# Altium schematic symbol library IC.SchLib: 555 symbols (part 6 of 15) (continued)
## LFE2M100-7FN900C (continued)
part P pins: AF24 LRC_SQ_REFCLKN, AG24 LRC_SQ_REFCLKP, AH18 LRC_SQ_VCCRX3, AH19 LRC_SQ_VCCRX2, AH20 LRC_SQ_VCCIB2, AH21 LRC_SQ_VCCTX3, AH22 LRC_SQ_VCCTX2, AH23 LRC_SQ_VCCOB2, AH24 LRC_SQ_VCCP, AH25 LRC_SQ_VCCOB1, AH26 LRC_SQ_VCCTX1, AH27 LRC_SQ_VCCTX0, AH28 LRC_SQ_VCCIB1, AH29 LRC_SQ_VCCRX1, AH30 LRC_SQ_VCCRX0, AJ18 LRC_SQ_VCCIB3, AJ19 LRC_SQ_HDINN3, AJ20 LRC_SQ_HDINN2, AJ22 LRC_SQ_HDOUTN3, AJ23 LRC_SQ_HDOUTN2, AJ24 LRC_SQ_VCCAUX33, AJ25 LRC_SQ_HDOUTN1, AJ26 LRC_SQ_HDOUTN0, AJ28 LRC_SQ_HDINN1, AJ29 LRC_SQ_HDINN0, AJ30 LRC_SQ_VCCIB0, AK19 LRC_SQ_HDINP3, AK20 LRC_SQ_HDINP2, AK21 LRC_SQ_VCCOB3, AK22 LRC_SQ_HDOUTP3, AK23 LRC_SQ_HDOUTP2, AK25 LRC_SQ_HDOUTP1, AK26 LRC_SQ_HDOUTP0, AK27 LRC_SQ_VCCOB0, AK28 LRC_SQ_HDINP1, AK29 LRC_SQ_HDINP0
part Q pins: AF7 LLC_SQ_REFCLKN, AG7 LLC_SQ_REFCLKP, AH1 LLC_SQ_VCCRX3, AH2 LLC_SQ_VCCRX2, AH3 LLC_SQ_VCCIB2, AH4 LLC_SQ_VCCTX3, AH5 LLC_SQ_VCCTX2, AH6 LLC_SQ_VCCOB2, AH7 LLC_SQ_VCCP, AH8 LLC_SQ_VCCOB1, AH9 LLC_SQ_VCCTX1, AH10 LLC_SQ_VCCTX0, AH11 LLC_SQ_VCCIB1, AH12 LLC_SQ_VCCRX1, AH13 LLC_SQ_VCCRX0, AJ1 LLC_SQ_VCCIB3, AJ2 LLC_SQ_HDINN3, AJ3 LLC_SQ_HDINN2, AJ5 LLC_SQ_HDOUTN3, AJ6 LLC_SQ_HDOUTN2, AJ7 LLC_SQ_VCCAUX33, AJ8 LLC_SQ_HDOUTN1, AJ9 LLC_SQ_HDOUTN0, AJ11 LLC_SQ_HDINN1, AJ12 LLC_SQ_HDINN0, AJ13 LLC_SQ_VCCIB0, AK2 LLC_SQ_HDINP3, AK3 LLC_SQ_HDINP2, AK4 LLC_SQ_VCCOB3, AK5 LLC_SQ_HDOUTP3, AK6 LLC_SQ_HDOUTP2, AK8 LLC_SQ_HDOUTP1, AK9 LLC_SQ_HDOUTP0, AK10 LLC_SQ_VCCOB0, AK11 LLC_SQ_HDINP1, AK12 LLC_SQ_HDINP0
part R pins: AB8 LLM0_PLLCAP, AB22 RLM0_PLLCAP, G23 XRES
part A text: SUPPLIES
part B text: SUPPLIES
part D text: BANK 0
part E text: BANK 1
part F text: BANK 2
part G text: BANK 3
part H text: BANK 4
part I text: BANK 5
part J text: BANK 6
part K text: BANK 7
part L text: BANK 8
part M text: JTAG
part N text: SERDES
part O text: SERDES
part P text: SERDES
part Q text: SERDES

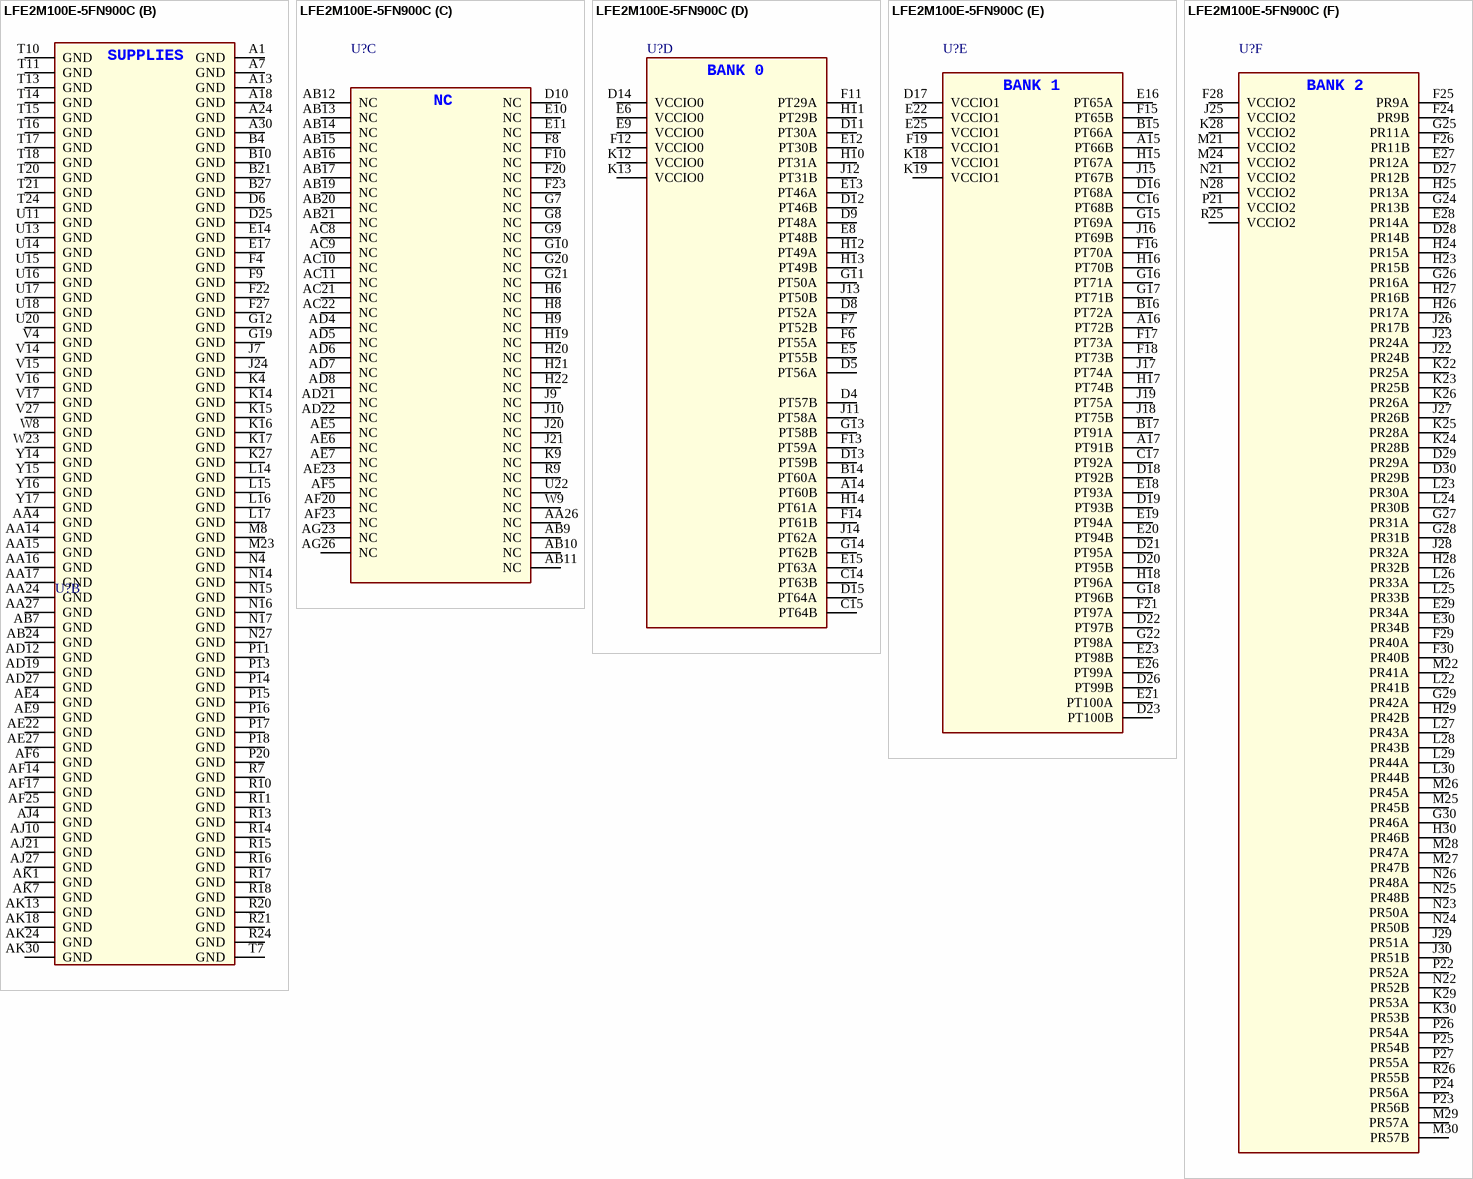
[diagram p23: symbol LFE2M100E-5FN900C]

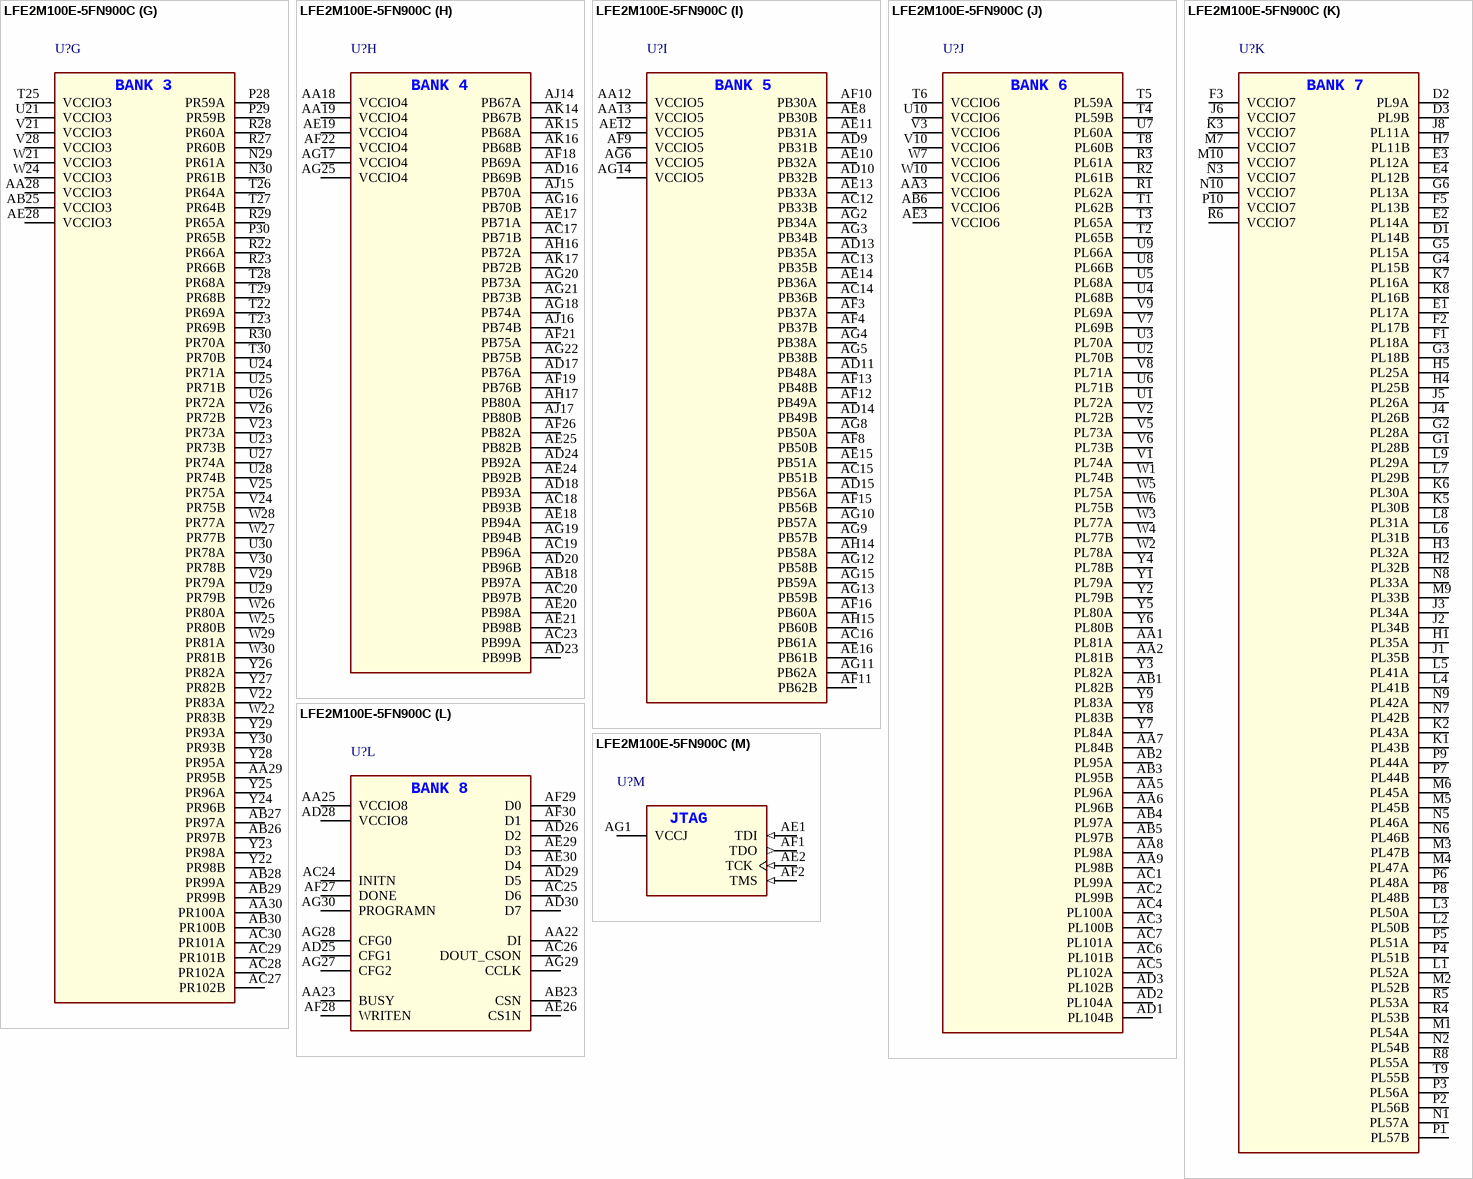
[diagram p24: symbol LFE2M100E-5FN900C]

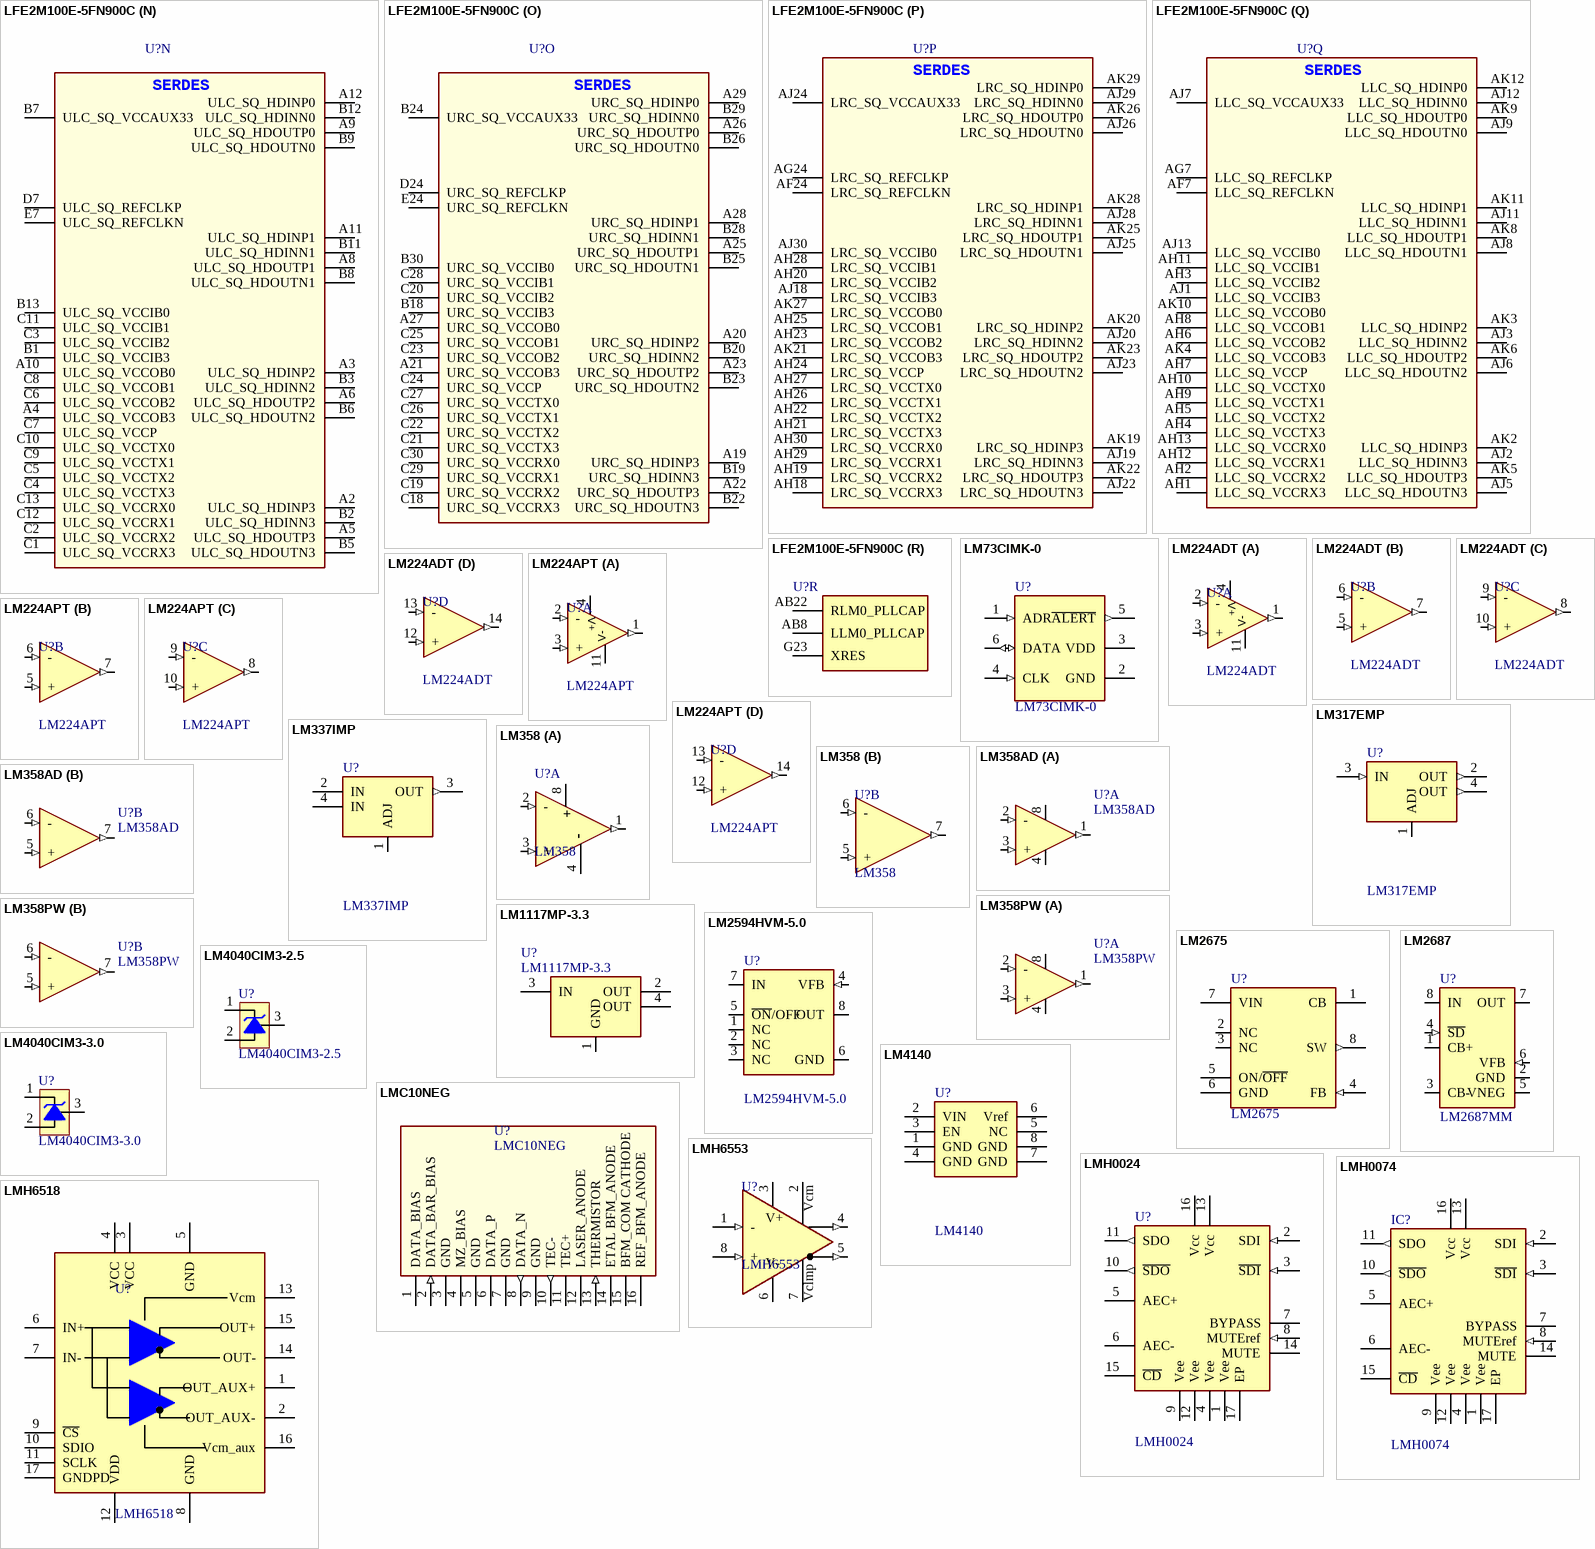
[diagram p25: symbols LFE2M100E-5FN900C to LMH6553]

## LFE2M100E-5FN900C
designator U?, comment LFE2M100-5FN900C  (value not drawn)
ECP2M 1.2V  FPGA, 416 I/Os, 95K LUTs, 900-Ball fpBGA, Speed Grade 5, Commercial Grade, Pb-Free; Manufacturer: Lattice; Sort: 510; Tech: SMDR; Manufacturer No: LFE2M100-5FN900C; Package: FPBGA900; Price: 0
footprint FPBGA900 (BGA, 900-Leads, Body 31,0x31,0mm,  Pitch 1,00mm)
part A pins: AA10 VCCAUX (power), AA11 VCCAUX (power), AA20 VCCAUX (power), AA21 VCCAUX (power), K10 VCCAUX (power), K11 VCCAUX (power), K20 VCCAUX (power), K21 VCCAUX (power), L10 VCCAUX (power), L11 VCCAUX (power), L12 VCC (power), L13 VCC (power), L18 VCC (power), L19 VCC (power), L20 VCCAUX (power), L21 VCCAUX (power), M11 VCC (power), M12 VCC (power), M13 VCC (power), M14 VCC (power), M15 VCC (power), M16 VCC (power), M17 VCC (power), M18 VCC (power), M19 VCC (power), M20 VCC (power), N11 VCC (power), N12 VCC (power), N13 VCCPLL (power), N18 VCCPLL (power), N19 VCC (power), N20 VCC (power), P12 VCC (power), P19 VCC (power), R12 VCC (power), R19 VCC (power), T12 VCC (power), T19 VCC (power), U12 VCC (power), U19 VCC (power), V11 VCC (power), V12 VCC (power), V13 VCCPLL (power), V18 VCCPLL (power), V19 VCC (power), V20 VCC (power), W11 VCC (power), W12 VCC (power), W13 VCC (power), W14 VCC (power), W15 VCC (power), W16 VCC (power), W17 VCC (power), W18 VCC (power), W19 VCC (power), W20 VCC (power), Y10 VCCAUX (power), Y11 VCCAUX (power), Y12 VCC (power), Y13 VCC (power), Y18 VCC (power), Y19 VCC (power), Y20 VCCAUX (power), Y21 VCCAUX (power)
part B pins: A1 GND (power), A7 GND (power), A13 GND (power), A18 GND (power), A24 GND (power), A30 GND (power), AA4 GND (power), AA14 GND (power), AA15 GND (power), AA16 GND (power), AA17 GND (power), AA24 GND (power), AA27 GND (power), AB7 GND (power), AB24 GND (power), AD12 GND (power), AD19 GND (power), AD27 GND (power), AE4 GND (power), AE9 GND (power), AE22 GND (power), AE27 GND (power), AF6 GND (power), AF14 GND (power), AF17 GND (power), AF25 GND (power), AJ4 GND (power), AJ10 GND (power), AJ21 GND (power), AJ27 GND (power), AK1 GND (power), AK7 GND (power), AK13 GND (power), AK18 GND (power), AK24 GND (power), AK30 GND (power), B4 GND (power), B10 GND (power), B21 GND (power), B27 GND (power), D6 GND (power), D25 GND (power), E14 GND (power), E17 GND (power), F4 GND (power), F9 GND (power), F22 GND (power), F27 GND (power), G12 GND (power), G19 GND (power), J7 GND (power), J24 GND (power), K4 GND (power), K14 GND (power), K15 GND (power), K16 GND (power), K17 GND (power), K27 GND (power), L14 GND (power), L15 GND (power), L16 GND (power), L17 GND (power), M8 GND (power), M23 GND (power), N4 GND (power), N14 GND (power), N15 GND (power), N16 GND (power), N17 GND (power), N27 GND (power), P11 GND (power), P13 GND (power), P14 GND (power), P15 GND (power), P16 GND (power), P17 GND (power), P18 GND (power), P20 GND (power), R7 GND (power), R10 GND (power), R11 GND (power), R13 GND (power), R14 GND (power), R15 GND (power), R16 GND (power), R17 GND (power), R18 GND (power), R20 GND (power), R21 GND (power), R24 GND (power), T7 GND (power), T10 GND (power), T11 GND (power), T13 GND (power), T14 GND (power), T15 GND (power), T16 GND (power), T17 GND (power), T18 GND (power), T20 GND (power), T21 GND (power), T24 GND (power), U11 GND (power), U13 GND (power), U14 GND (power), U15 GND (power), U16 GND (power), U17 GND (power), U18 GND (power), U20 GND (power), V4 GND (power), V14 GND (power), V15 GND (power), V16 GND (power), V17 GND (power), V27 GND (power), W8 GND (power), W23 GND (power), Y14 GND (power), Y15 GND (power), Y16 GND (power), Y17 GND (power)
part C pins: AA26 NC, AB9 NC, AB10 NC, AB11 NC, AB12 NC, AB13 NC, AB14 NC, AB15 NC, AB16 NC, AB17 NC, AB19 NC, AB20 NC, AB21 NC, AC8 NC, AC9 NC, AC10 NC, AC11 NC, AC21 NC, AC22 NC, AD4 NC, AD5 NC, AD6 NC, AD7 NC, AD8 NC, AD21 NC, AD22 NC, AE5 NC, AE6 NC, AE7 NC, AE23 NC, AF5 NC, AF20 NC, AF23 NC, AG23 NC, AG26 NC, D10 NC, E10 NC, E11 NC, F8 NC, F10 NC, F20 NC, F23 NC, G7 NC, G8 NC, G9 NC, G10 NC, G20 NC, G21 NC, H6 NC, H8 NC, H9 NC, H19 NC, H20 NC, H21 NC, H22 NC, J9 NC, J10 NC, J20 NC, J21 NC, K9 NC, R9 NC, U22 NC, W9 NC
part D pins: A14 PT60B, B14 PT60A, C14 PT63B, C15 PT64B, D4 PT57B, D5 PT56A, D8 PT52A, D9 PT48A, D11 PT30A, D12 PT46B, D13 PT59B, D14 VCCIO0 (power), D15 PT64A, E5 PT55B, E6 VCCIO0 (power), E8 PT48B, E9 VCCIO0 (power), E12 PT30B, E13 PT46A, E15 PT63A, F6 PT55A, F7 PT52B, F11 PT29A, F12 VCCIO0 (power), F13 PT59A, F14 PT61B, G11 PT50A, G13 PT58B, G14 PT62B, H10 PT31A, H11 PT29B, H12 PT49A, H13 PT49B, H14 PT61A, J11 PT58A, J12 PT31B, J13 PT50B, J14 PT62A, K12 VCCIO0 (power), K13 VCCIO0 (power)
part E pins: A15 PT66B, A16 PT72B, A17 PT91B, B15 PT66A, B16 PT72A, B17 PT91A, C16 PT68B, C17 PT92A, D16 PT68A, D17 VCCIO1 (power), D18 PT92B, D19 PT93B, D20 PT95B, D21 PT95A, D22 PT97B, D23 PT100B, D26 PT99B, E16 PT65A, E18 PT93A, E19 PT94A, E20 PT94B, E21 PT100A, E22 VCCIO1 (power), E23 PT98B, E25 VCCIO1 (power), E26 PT99A, F15 PT65B, F16 PT70A, F17 PT73A, F18 PT73B, F19 VCCIO1 (power), F21 PT97A, G15 PT69A, G16 PT71A, G17 PT71B, G18 PT96B, G22 PT98A, H15 PT67A, H16 PT70B, H17 PT74B, H18 PT96A, J15 PT67B, J16 PT69B, J17 PT74A, J18 PT75B, J19 PT75A, K18 VCCIO1 (power), K19 VCCIO1 (power)
part F pins: D27 PR12B, D28 PR14B, D29 PR29A, D30 PR29B, E27 PR12A, E28 PR14A, E29 PR34A, E30 PR34B, F24 PR9B, F25 PR9A, F26 PR11B, F28 VCCIO2 (power), F29 PR40A, F30 PR40B, G24 PR13B, G25 PR11A, G26 PR16A, G27 PR31A, G28 PR31B, G29 PR42A, G30 PR46A, H23 PR15B, H24 PR15A, H25 PR13A, H26 PR17A, H27 PR16B, H28 PR32B, H29 PR42B, H30 PR46B, J22 PR24B, J23 PR24A, J25 VCCIO2 (power), J26 PR17B, J27 PR26B, J28 PR32A, J29 PR51A, J30 PR51B, K22 PR25A, K23 PR25B, K24 PR28B, K25 PR28A, K26 PR26A, K28 VCCIO2 (power), K29 PR53A, K30 PR53B, L22 PR41B, L23 PR30A, L24 PR30B, L25 PR33B, L26 PR33A, L27 PR43A, L28 PR43B, L29 PR44A, L30 PR44B, M21 VCCIO2 (power), M22 PR41A, M24 VCCIO2 (power), M25 PR45B, M26 PR45A, M27 PR47B, M28 PR47A, M29 PR57A, M30 PR57B, N21 VCCIO2 (power), N22 PR52B, N23 PR50A, N24 PR50B, N25 PR48B, N26 PR48A, N28 VCCIO2 (power), P21 VCCIO2 (power), P22 PR52A, P23 PR56B, P24 PR56A, P25 PR54B, P26 PR54A, P27 PR55A, R25 VCCIO2 (power), R26 PR55B
part G pins: AA28 VCCIO3 (power), AA29 PR95B, AA30 PR100A, AB25 VCCIO3 (power), AB26 PR97B, AB27 PR97A, AB28 PR99A, AB29 PR99B, AB30 PR100B, AC27 PR102B, AC28 PR102A, AC29 PR101B, AC30 PR101A, AE28 VCCIO3 (power), N29 PR61A, N30 PR61B, P28 PR59A, P29 PR59B, P30 PR65B, R22 PR66A, R23 PR66B, R27 PR60B, R28 PR60A, R29 PR65A, R30 PR70A, T22 PR69A, T23 PR69B, T25 VCCIO3 (power), T26 PR64A, T27 PR64B, T28 PR68A, T29 PR68B, T30 PR70B, U21 VCCIO3 (power), U23 PR73B, U24 PR71A, U25 PR71B, U26 PR72A, U27 PR74A, U28 PR74B, U29 PR79B, U30 PR78A, V21 VCCIO3 (power), V22 PR83A, V23 PR73A, V24 PR75B, V25 PR75A, V26 PR72B, V28 VCCIO3 (power), V29 PR79A, V30 PR78B, W21 VCCIO3 (power), W22 PR83B, W24 VCCIO3 (power), W25 PR80B, W26 PR80A, W27 PR77B, W28 PR77A, W29 PR81A, W30 PR81B, Y22 PR98B, Y23 PR98A, Y24 PR96B, Y25 PR96A, Y26 PR82A, Y27 PR82B, Y28 PR95A, Y29 PR93A, Y30 PR93B
part H pins: AA18 VCCIO4 (power), AA19 VCCIO4 (power), AB18 PB97A, AC17 PB71B, AC18 PB93B, AC19 PB96A, AC20 PB97B, AC23 PB99A, AD16 PB69B, AD17 PB76A, AD18 PB93A, AD20 PB96B, AD23 PB99B, AD24 PB92A, AE17 PB71A, AE18 PB94A, AE19 VCCIO4 (power), AE20 PB98A, AE21 PB98B, AE24 PB92B, AE25 PB82B, AF18 PB69A, AF19 PB76B, AF21 PB75A, AF22 VCCIO4 (power), AF26 PB82A, AG16 PB70B, AG17 VCCIO4 (power), AG18 PB74A, AG19 PB94B, AG20 PB73A, AG21 PB73B, AG22 PB75B, AG25 VCCIO4 (power), AH16 PB72A, AH17 PB80A, AJ14 PB67A, AJ15 PB70A, AJ16 PB74B, AJ17 PB80B, AK14 PB67B, AK15 PB68A, AK16 PB68B, AK17 PB72B
part I pins: AA12 VCCIO5 (power), AA13 VCCIO5 (power), AC12 PB33B, AC13 PB35B, AC14 PB36B, AC15 PB51B, AC16 PB61A, AD9 PB31B, AD10 PB32B, AD11 PB48A, AD13 PB35A, AD14 PB49B, AD15 PB56A, AE8 PB30B, AE10 PB32A, AE11 PB31A, AE12 VCCIO5 (power), AE13 PB33A, AE14 PB36A, AE15 PB51A, AE16 PB61B, AF3 PB37A, AF4 PB37B, AF8 PB50B, AF9 VCCIO5 (power), AF10 PB30A, AF11 PB62B, AF12 PB49A, AF13 PB48B, AF15 PB56B, AF16 PB60A, AG2 PB34A, AG3 PB34B, AG4 PB38A, AG5 PB38B, AG6 VCCIO5 (power), AG8 PB50A, AG9 PB57B, AG10 PB57A, AG11 PB62A, AG12 PB58B, AG13 PB59B, AG14 VCCIO5 (power), AG15 PB59A, AH14 PB58A, AH15 PB60B
part J pins: AA1 PL81A, AA2 PL81B, AA3 VCCIO6 (power), AA5 PL96A, AA6 PL96B, AA7 PL84B, AA8 PL98A, AA9 PL98B, AB1 PL82B, AB2 PL95A, AB3 PL95B, AB4 PL97A, AB5 PL97B, AB6 VCCIO6 (power), AC1 PL99A, AC2 PL99B, AC3 PL100B, AC4 PL100A, AC5 PL102A, AC6 PL101B, AC7 PL101A, AD1 PL104B, AD2 PL104A, AD3 PL102B, AE3 VCCIO6 (power), R1 PL62A, R2 PL61B, R3 PL61A, T1 PL62B, T2 PL65B, T3 PL65A, T4 PL59B, T5 PL59A, T6 VCCIO6 (power), T8 PL60B, U1 PL72A, U2 PL70B, U3 PL70A, U4 PL68B, U5 PL68A, U6 PL71B, U7 PL60A, U8 PL66B, U9 PL66A, U10 VCCIO6 (power), V1 PL74A, V2 PL72B, V3 VCCIO6 (power), V5 PL73A, V6 PL73B, V7 PL69B, V8 PL71A, V9 PL69A, V10 VCCIO6 (power), W1 PL74B, W2 PL78A, W3 PL77A, W4 PL77B, W5 PL75A, W6 PL75B, W7 VCCIO6 (power), W10 VCCIO6 (power), Y1 PL79A, Y2 PL79B, Y3 PL82A, Y4 PL78B, Y5 PL80A, Y6 PL80B, Y7 PL84A, Y8 PL83B, Y9 PL83A
part K pins: D1 PL14B, D2 PL9A, D3 PL9B, E1 PL17A, E2 PL14A, E3 PL12A, E4 PL12B, F1 PL18A, F2 PL17B, F3 VCCIO7 (power), F5 PL13B, G1 PL28B, G2 PL28A, G3 PL18B, G4 PL15B, G5 PL15A, G6 PL13A, H1 PL35A, H2 PL32B, H3 PL32A, H4 PL25B, H5 PL25A, H7 PL11B, J1 PL35B, J2 PL34B, J3 PL34A, J4 PL26B, J5 PL26A, J6 VCCIO7 (power), J8 PL11A, K1 PL43B, K2 PL43A, K3 VCCIO7 (power), K5 PL30B, K6 PL30A, K7 PL16A, K8 PL16B, L1 PL52A, L2 PL50B, L3 PL50A, L4 PL41B, L5 PL41A, L6 PL31B, L7 PL29B, L8 PL31A, L9 PL29A, M1 PL54A, M2 PL52B, M3 PL47B, M4 PL47A, M5 PL45B, M6 PL45A, M7 VCCIO7 (power), M9 PL33B, M10 VCCIO7 (power), N1 PL57A, N2 PL54B, N3 VCCIO7 (power), N5 PL46A, N6 PL46B, N7 PL42B, N8 PL33A, N9 PL42A, N10 VCCIO7 (power), P1 PL57B, P2 PL56B, P3 PL56A, P4 PL51B, P5 PL51A, P6 PL48A, P7 PL44B, P8 PL48B, P9 PL44A, P10 VCCIO7 (power), R4 PL53B, R5 PL53A, R6 VCCIO7 (power), R8 PL55A, T9 PL55B
part L pins: AA22 DI, AA23 BUSY, AA25 VCCIO8 (power), AB23 CSN, AC24 INITN, AC25 D6, AC26 DOUT_CSON, AD25 CFG1, AD26 D2, AD28 VCCIO8 (power), AD29 D5, AD30 D7, AE26 CS1N, AE29 D3, AE30 D4, AF27 DONE, AF28 WRITEN, AF29 D0, AF30 D1, AG27 CFG2, AG28 CFG0, AG29 CCLK, AG30 PROGRAMN
part M pins: AE1 TDI (in), AE2 TCK (in), AF1 TDO (out), AF2 TMS (in), AG1 VCCJ (power)
part N pins: A2 ULC_SQ_HDINP3, A3 ULC_SQ_HDINP2, A4 ULC_SQ_VCCOB3, A5 ULC_SQ_HDOUTP3, A6 ULC_SQ_HDOUTP2, A8 ULC_SQ_HDOUTP1, A9 ULC_SQ_HDOUTP0, A10 ULC_SQ_VCCOB0, A11 ULC_SQ_HDINP1, A12 ULC_SQ_HDINP0, B1 ULC_SQ_VCCIB3, B2 ULC_SQ_HDINN3, B3 ULC_SQ_HDINN2, B5 ULC_SQ_HDOUTN3, B6 ULC_SQ_HDOUTN2, B7 ULC_SQ_VCCAUX33, B8 ULC_SQ_HDOUTN1, B9 ULC_SQ_HDOUTN0, B11 ULC_SQ_HDINN1, B12 ULC_SQ_HDINN0, B13 ULC_SQ_VCCIB0, C1 ULC_SQ_VCCRX3, C2 ULC_SQ_VCCRX2, C3 ULC_SQ_VCCIB2, C4 ULC_SQ_VCCTX3, C5 ULC_SQ_VCCTX2, C6 ULC_SQ_VCCOB2, C7 ULC_SQ_VCCP, C8 ULC_SQ_VCCOB1, C9 ULC_SQ_VCCTX1, C10 ULC_SQ_VCCTX0, C11 ULC_SQ_VCCIB1, C12 ULC_SQ_VCCRX1, C13 ULC_SQ_VCCRX0, D7 ULC_SQ_REFCLKP, E7 ULC_SQ_REFCLKN
part O pins: A19 URC_SQ_HDINP3, A20 URC_SQ_HDINP2, A21 URC_SQ_VCCOB3, A22 URC_SQ_HDOUTP3, A23 URC_SQ_HDOUTP2, A25 URC_SQ_HDOUTP1, A26 URC_SQ_HDOUTP0, A27 URC_SQ_VCCOB0, A28 URC_SQ_HDINP1, A29 URC_SQ_HDINP0, B18 URC_SQ_VCCIB3, B19 URC_SQ_HDINN3, B20 URC_SQ_HDINN2, B22 URC_SQ_HDOUTN3, B23 URC_SQ_HDOUTN2, B24 URC_SQ_VCCAUX33, B25 URC_SQ_HDOUTN1, B26 URC_SQ_HDOUTN0, B28 URC_SQ_HDINN1, B29 URC_SQ_HDINN0, B30 URC_SQ_VCCIB0, C18 URC_SQ_VCCRX3, C19 URC_SQ_VCCRX2, C20 URC_SQ_VCCIB2, C21 URC_SQ_VCCTX3, C22 URC_SQ_VCCTX2, C23 URC_SQ_VCCOB2, C24 URC_SQ_VCCP, C25 URC_SQ_VCCOB1, C26 URC_SQ_VCCTX1, C27 URC_SQ_VCCTX0, C28 URC_SQ_VCCIB1, C29 URC_SQ_VCCRX1, C30 URC_SQ_VCCRX0, D24 URC_SQ_REFCLKP, E24 URC_SQ_REFCLKN
part P pins: AF24 LRC_SQ_REFCLKN, AG24 LRC_SQ_REFCLKP, AH18 LRC_SQ_VCCRX3, AH19 LRC_SQ_VCCRX2, AH20 LRC_SQ_VCCIB2, AH21 LRC_SQ_VCCTX3, AH22 LRC_SQ_VCCTX2, AH23 LRC_SQ_VCCOB2, AH24 LRC_SQ_VCCP, AH25 LRC_SQ_VCCOB1, AH26 LRC_SQ_VCCTX1, AH27 LRC_SQ_VCCTX0, AH28 LRC_SQ_VCCIB1, AH29 LRC_SQ_VCCRX1, AH30 LRC_SQ_VCCRX0, AJ18 LRC_SQ_VCCIB3, AJ19 LRC_SQ_HDINN3, AJ20 LRC_SQ_HDINN2, AJ22 LRC_SQ_HDOUTN3, AJ23 LRC_SQ_HDOUTN2, AJ24 LRC_SQ_VCCAUX33, AJ25 LRC_SQ_HDOUTN1, AJ26 LRC_SQ_HDOUTN0, AJ28 LRC_SQ_HDINN1, AJ29 LRC_SQ_HDINN0, AJ30 LRC_SQ_VCCIB0, AK19 LRC_SQ_HDINP3, AK20 LRC_SQ_HDINP2, AK21 LRC_SQ_VCCOB3, AK22 LRC_SQ_HDOUTP3, AK23 LRC_SQ_HDOUTP2, AK25 LRC_SQ_HDOUTP1, AK26 LRC_SQ_HDOUTP0, AK27 LRC_SQ_VCCOB0, AK28 LRC_SQ_HDINP1, AK29 LRC_SQ_HDINP0
part Q pins: AF7 LLC_SQ_REFCLKN, AG7 LLC_SQ_REFCLKP, AH1 LLC_SQ_VCCRX3, AH2 LLC_SQ_VCCRX2, AH3 LLC_SQ_VCCIB2, AH4 LLC_SQ_VCCTX3, AH5 LLC_SQ_VCCTX2, AH6 LLC_SQ_VCCOB2, AH7 LLC_SQ_VCCP, AH8 LLC_SQ_VCCOB1, AH9 LLC_SQ_VCCTX1, AH10 LLC_SQ_VCCTX0, AH11 LLC_SQ_VCCIB1, AH12 LLC_SQ_VCCRX1, AH13 LLC_SQ_VCCRX0, AJ1 LLC_SQ_VCCIB3, AJ2 LLC_SQ_HDINN3, AJ3 LLC_SQ_HDINN2, AJ5 LLC_SQ_HDOUTN3, AJ6 LLC_SQ_HDOUTN2, AJ7 LLC_SQ_VCCAUX33, AJ8 LLC_SQ_HDOUTN1, AJ9 LLC_SQ_HDOUTN0, AJ11 LLC_SQ_HDINN1, AJ12 LLC_SQ_HDINN0, AJ13 LLC_SQ_VCCIB0, AK2 LLC_SQ_HDINP3, AK3 LLC_SQ_HDINP2, AK4 LLC_SQ_VCCOB3, AK5 LLC_SQ_HDOUTP3, AK6 LLC_SQ_HDOUTP2, AK8 LLC_SQ_HDOUTP1, AK9 LLC_SQ_HDOUTP0, AK10 LLC_SQ_VCCOB0, AK11 LLC_SQ_HDINP1, AK12 LLC_SQ_HDINP0
part R pins: AB8 LLM0_PLLCAP, AB22 RLM0_PLLCAP, G23 XRES
part A text: SUPPLIES
part B text: SUPPLIES
part D text: BANK 0
part E text: BANK 1
part F text: BANK 2
part G text: BANK 3
part H text: BANK 4
part I text: BANK 5
part J text: BANK 6
part K text: BANK 7
part L text: BANK 8
part M text: JTAG
part N text: SERDES
part O text: SERDES
part P text: SERDES
part Q text: SERDES

## LM73CIMK-0
designator U?
Digital Temperature Sensor I2C SOT23-6; Manufacturer: National Semiconductors; Sort: 510; Tech: SMDR; Manufacturer No: LM73CIMK-0; Package: SOT23-6; Price: 0
footprint SOT23-6
pins: 1 ADR (in), 2 GND (power), 3 VDD (power), 4 CLK (in), 5 ~{ALERT} (out), 6 DATA (io)

## LM224ADT
designator U?
Quad Operational amplifier SOIC14; Manufacturer: STM, Farnell; Manufacturer No: LM224ADT, 1750139; Comment2: 3..30Vcc 1.3MHzbw 1.5mAcc; Sort: 510; Tech: SMDR; Package: SOIC14; Price: 0
footprint SOIC14-1 (Small IC 14 pin)
part A pins: 1 OUT (out), 2 - (in), 3 + (in), 4 +V (power), 11 -V (power)
part B pins: 5 + (in), 6 - (in), 7 OUT (out)
part C pins: 8 OUT (out), 9 - (in), 10 + (in)
part D pins: 12 + (in), 13 - (in), 14 OUT (out)
part A text: V+; V-

## LM224APT
designator U?
Quad Operational amplifier TSSOP14; Manufacturer: STM, Farnell; Manufacturer No: LM224APT, 1750140; Comment2: 3..30Vcc 0..28Vinp 1.3MHzbw 1.5mAcc; Sort: 510; Tech: SMDR; Package: TSSOP14; Price: 0.4
footprint TSSOP14 (TSSOP14 5x4.4mm R0.65mm)
part A pins: 1 OUT (out), 2 - (in), 3 + (in), 4 +V (power), 11 -V (power)
part B pins: 5 + (in), 6 - (in), 7 OUT (out)
part C pins: 8 OUT (out), 9 - (in), 10 + (in)
part D pins: 12 + (in), 13 - (in), 14 OUT (out)
part A text: V+; V-

## LM317EMP
designator U?
3-Terminal Adjustable Regulator 1A; Manufacturer: National Semiconductor; Comment2: 40Vin, 1A; Sort: 510; Tech: SMDR; Manufacturer No: LM317EMP; Package: DDPak5; Price: 0
footprint SOT223
pins: 1 ADJ (hiz), 2 OUT (out), 3 IN (in), 4 OUT (out)

## LM337IMP
designator U?
3-Terminal Negative Adjustable Regulator 1A; Manufacturer: National Semiconductor, Farnell; Manufacturer No: LM337IMP, 9779213; Comment2: -1.2..-37Vout -40Vin  1Aout; Sort: 510; Tech: SMDR; Package: SOT223; Price: 2
footprint SOT223
pins: 1 ADJ, 2 IN (power), 3 OUT (out), 4 IN (power)

## LM358
designator U?
Operational amplifier; Manufacturer: National Semiconductors; Manufacturer No: LM358M; Sort: 510; Tech: SMDR; Package: SO8; Price: 0
footprint SOIC8-1
part A pins: 1 OUT (out), 2 - (in), 3 + (in), 4 -V (power), 8 +V (power)
part B pins: 5 + (in), 6 - (in), 7 OUT (out)

## LM358AD
designator U?
Operational amplifier dual; Manufacturer: Texas; Comment2: Vcc=32V; Sort: 510; Tech: SMDR; Manufacturer No: LM358AD; Package: SOIC8; Price: 0
footprint SOIC8-1
part A pins: 1 OUT (out), 2 - (in), 3 + (in), 4 -V (power), 8 +V (power)
part B pins: 5 + (in), 6 - (in), 7 OUT (out)

## LM358PW
designator U?
Operational amplifier dual; Manufacturer: Texas; Comment2: Vcc=32V; Sort: 510; Tech: SMDR; Manufacturer No: LM358PW; Package: TSSOP8; Price: 0
footprint TSSOP8 (TSSOP8 3x3mm R0.65mm)
part A pins: 1 OUT (out), 2 - (in), 3 + (in), 4 -V (power), 8 +V (power)
part B pins: 5 + (in), 6 - (in), 7 OUT (out)

## LM1117MP-3.3
designator U?
LDO regulator SOT223; Manufacturer No: LM1117IMP-3.3/NOPB, 1469051; Manufacturer: National, Farnell; Sort: 400; Tech: SMDR; Comment2: 4.5..20Vin 3.3Vout 0.8Aout; Package: SOT223; Price: 0,9
footprint SOT223
pins: 1 GND (power), 2 OUT (power), 3 IN (power), 4 OUT (power)

## LM2594HVM-5.0
designator U?
Regulated charge pump voltage inverter; Manufacturer: National; Comment2: 150KHz, 57Vin; 5.0Vout 0.5A; Sort: 510; Tech: SMDR; Manufacturer No: LM2594HVM-5.0; Package: SOIC8; Price: 0
footprint SOIC8-1
pins: 1 NC, 2 NC, 3 NC, 4 VFB (in), 5 ~{ON}/OFF (power), 6 GND (power), 7 IN (power), 8 OUT (power)

## LM2675
designator U?
Step down converter 2A SOIC8; Manufacturer: National Semiconductors; Sort: 510; Tech: SMDR; Manufacturer No: LM2675; Package: SOIC8; Price: 0
footprint SOIC8-1
pins: 1 CB, 2 NC, 3 NC, 4 FB (in), 5 ON/~{OFF}, 6 GND (power), 7 VIN (power), 8 SW (out)

## LM2687
designator U?, comment LM2687MM
Regulated charge pump voltage inverter; Manufacturer: National; Comment2: 100KHz 2.7-5.5Vin; 1.5-5.2Vout 10mA; Sort: 510; Tech: SMDR; Manufacturer No: LM2687MM; Package: MSOP8; Price: 0
footprint TSSOP8 (TSSOP8 3x3mm R0.65mm)
pins: 1 CB+, 2 GND (power), 3 CB-, 4 ~{SD} (in), 5 VNEG (power), 6 VFB (in), 7 OUT (power), 8 IN (power)

## LM4040CIM3-2.5
designator U?
Voltage reference; low noise; Manufacturer: National Semiconductors; Comment2: 3V, 0.1% 100ppm; Sort: 510; Tech: SMDR; Package: SOT23; Manufacturer No: LM4040CIM3-2.5; Price: 0
footprint SOT23-1
pins: 1 C, 2 A, 3 NC

## LM4040CIM3-3.0
designator U?
Voltage reference; low noise; Manufacturer: National Semiconductors; Comment2: 3V, 0.1% 100ppm; Sort: 510; Tech: SMDR; Package: SOT23; Manufacturer No: LM4040CIM3-3.0; Price: 0
footprint SOT23-1
pins: 1 C, 2 A, 3 NC

## LM4140
designator U?
High Precision Low Noise Low Dropout Voltage Reference; Manufacturer: National Semiconductor; Manufacturer No: LM4140ACM-1.2; Comment2: 3ppm/C, 1.25V; Sort: 510; Tech: SMDR; Package: SOIC8; Price: 0
footprint SOIC8-1
pins: 1 GND, 2 VIN, 3 EN, 4 GND, 5 NC, 6 Vref, 7 GND, 8 GND

## LMC10NEG
designator U?
10Gb/s InP MZ Modulator with DWDM Laser; Manufacturer: Bookham; Sort: 510; Tech: SMDR; Manufacturer No: LMC10NEG; Price: 0
footprint lmc10neg (10Gb/s PIN Preamp Receiver PT10GC)
pins: 1 DATA_BIAS (power), 2 DATA_BAR_BIAS (in), 3 GND (power), 4 MZ_BIAS (power), 5 GND (power), 6 DATA_P (power), 7 GND (power), 8 DATA_N (out), 9 GND (power), 10 TEC- (out), 11 TEC+ (power), 12 LASER_ANODE (power), 13 THERMISTOR (in), 14 ETAL BFM_ANODE (power), 15 BFM_COM CATHODE (power), 16 REF_BFM_ANODE (power)

## LMH0024
designator U?
SMPTE 259M/344M Adaptive Cable Equalizer; Manufacturer No: LMH0024MA; Manufacturer: National Semiconductor; Tech: SMDR; Sort: 510; Package: SOIC16; Price: 0
footprint SOIC16-1 (Small IC 16 pin)
pins: 1 Vee (power), 2 SDI (in), 3 ~{SDI} (in), 4 Vee (power), 5 AEC+, 6 AEC-, 7 BYPASS, 8 MUTEref (in), 9 Vee (power), 10 ~{SDO} (out), 11 SDO (out), 12 Vee (power), 13 Vcc (power), 14 MUTE, 15 ~{CD}, 16 Vcc (power), 17 EP (power)

## LMH0074
designator IC?
SMPTE 259M/344M Adaptive Cable Equalizer; Manufacturer No: LMH0074SQ; Manufacturer: National Semiconductor; Tech: SMDR; Sort: 510; Package: SQB16A
footprint SQB16A (QFN, 16-Leads, Body 4,1x4,1mm (max), Pitch 0,65mm, IPC Medium Density)
pins: 1 Vee (power), 2 SDI (in), 3 ~{SDI} (in), 4 Vee (power), 5 AEC+, 6 AEC-, 7 BYPASS, 8 MUTEref (in), 9 Vee (power), 10 ~{SDO} (out), 11 SDO (out), 12 Vee (power), 13 Vcc (power), 14 MUTE, 15 ~{CD}, 16 Vcc (power), 17 EP (power)

## LMH6518
designator U?
900MHz, Digitally Controlled, Variable Gain Amplifier; Manufacturer: National Semiconductor; Tech: SMDR; Sort: 510; Manufacturer No: LMH6518; Package: LLP16; Price: 0
footprint LLP16 (QFN, 16-Leads, Body 4,0x4,0mm (max), Pitch 0,50mm, IPC Medium Density)
pins: 1 OUT_AUX+, 2 OUT_AUX-, 3 VCC (power), 4 VCC (power), 5 GND (power), 6 IN+, 7 IN-, 8 GND (power), 9 ~{CS}, 10 SDIO, 11 SCLK, 12 VDD (power), 13 Vcm, 14 OUT-, 15 OUT+, 16 Vcm_aux, 17 GNDPD (power)

## LMH6553
designator U?
900MHz Fully Differential Amplifier with Output Limiting Clamp; Manufacturer: National Semiconductors; Sort: 510; Tech: SMDR; Manufacturer No: LMH6553; Package: SOP8; Price: 0
footprint SOP127P600X168_HS-8N (SOP, 8-Leads, Body 4,9x3,9mm (max), Pitch 1,27mm, IPC Medium Density)
footprint QFN50P250X300X80-8N (QFN, 8-Leads, Body 3,0x2,5mm (max), Pitch 0,50mm, IPC Medium Density)
pins: 1 - (in), 2 Vcm, 3 +V (power), 4 OUT+ (out), 5 OUT- (out), 6 -V (power), 7 Vclamp, 8 + (in)
text: V+; V-; Vclmp

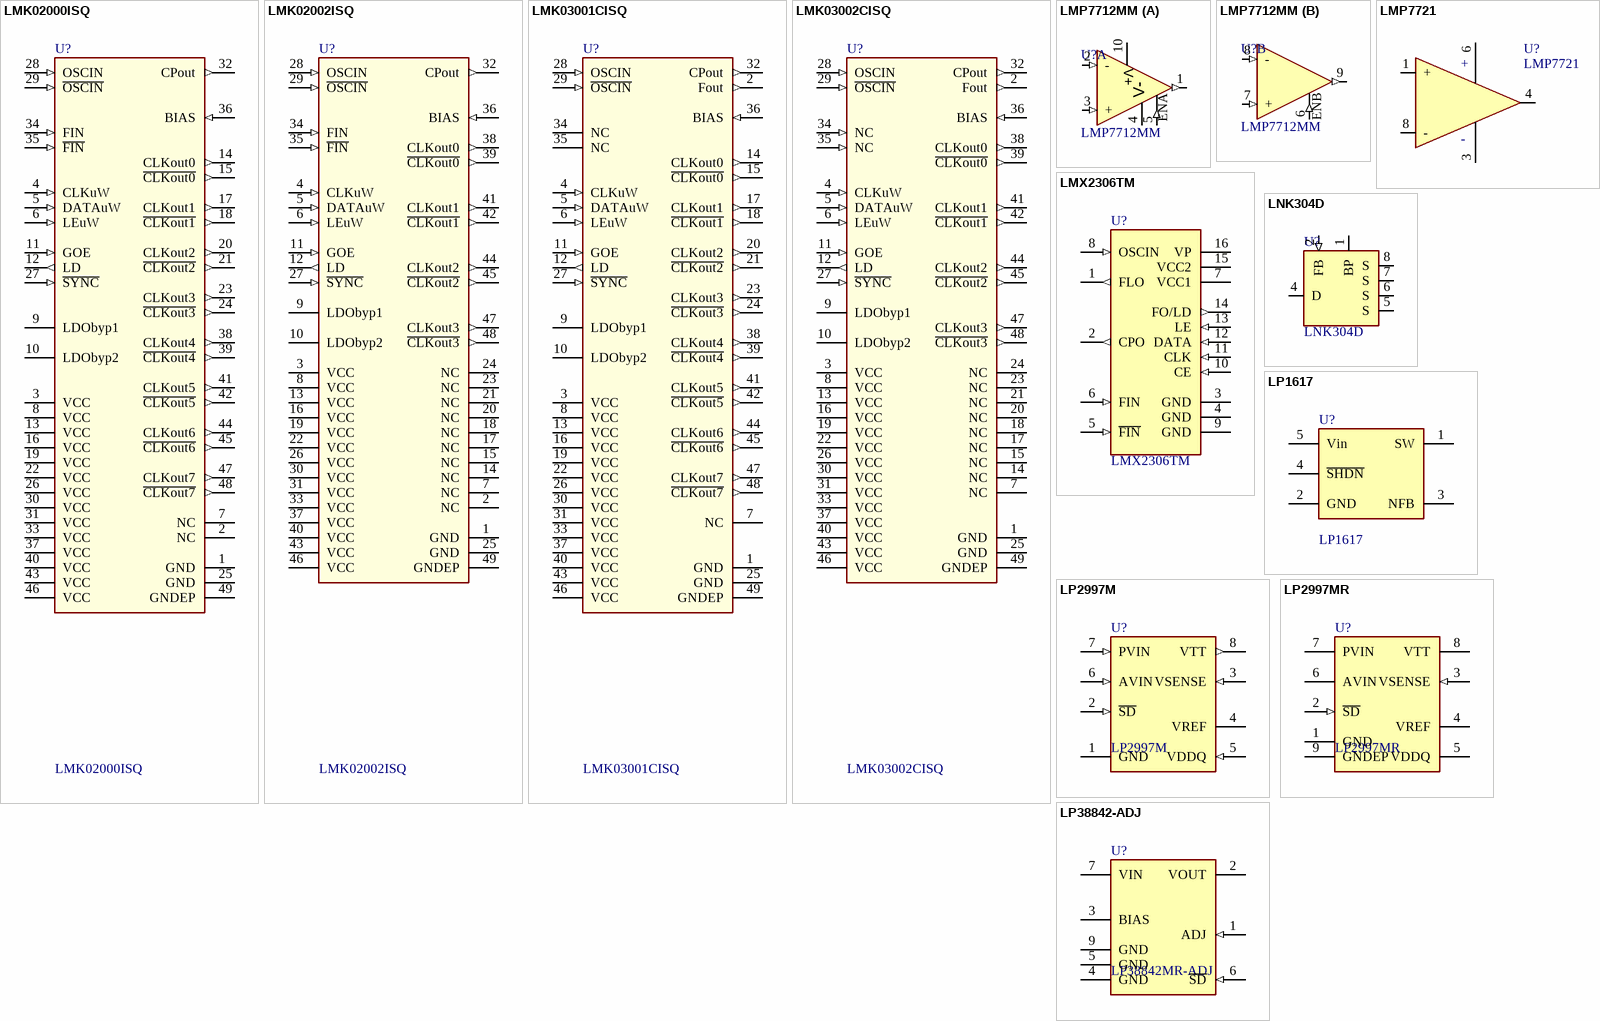
[diagram p26: symbols LMK02000ISQ to LP38842-ADJ]

## LMK02000ISQ
designator U?
Precision Clock Conditioner with Integrated PLL; QFN48; Manufacturer: National Semiconductors; Comment2: 3.3V; Sort: 510; Tech: SMDR; Manufacturer No: LMK02000ISQ; Package: QFN48; Price: 0
footprint QFN48-1 (QFN48; 48 Leads; Body Width 7.0 mm; Pitch 0.5 mm)
pins: 1 GND (power), 2 NC, 3 VCC (power), 4 CLKuW (in), 5 DATAuW (in), 6 LEuW (in), 7 NC, 8 VCC (power), 9 LDObyp1, 10 LDObyp2, 11 GOE (in), 12 LD (out), 13 VCC (power), 14 CLKout0 (out), 15 ~{CLKout0} (out), 16 VCC (power), 17 CLKout1 (out), 18 ~{CLKout1} (out), 19 VCC (power), 20 CLKout2 (out), 21 ~{CLKout2} (out), 22 VCC (power), 23 CLKout3 (out), 24 ~{CLKout3} (out), 25 GND (power), 26 VCC (power), 27 ~{SYNC} (in), 28 OSCIN (in), 29 ~{OSCIN} (in), 30 VCC (power), 31 VCC (power), 32 CPout (out), 33 VCC (power), 34 FIN (in), 35 ~{FIN} (in), 36 BIAS (in), 37 VCC (power), 38 CLKout4 (out), 39 ~{CLKout4} (out), 40 VCC (power), 41 CLKout5 (out), 42 ~{CLKout5} (out), 43 VCC (power), 44 CLKout6 (out), 45 ~{CLKout6} (out), 46 VCC (power), 47 CLKout7 (out), 48 ~{CLKout7} (out), 49 GNDEP (power)

## LMK02002ISQ
designator U?
Precision Clock Conditioner with Integrated PLL; QFN48; Manufacturer: National Semiconductors; Comment2: 3.3V; Sort: 510; Tech: SMDR; Manufacturer No: LMK02002ISQ; Package: QFN48; Price: 0
footprint QFN48-1 (QFN48; 48 Leads; Body Width 7.0 mm; Pitch 0.5 mm)
pins: 1 GND (power), 2 NC, 3 VCC (power), 4 CLKuW (in), 5 DATAuW (in), 6 LEuW (in), 7 NC, 8 VCC (power), 9 LDObyp1, 10 LDObyp2, 11 GOE (in), 12 LD (out), 13 VCC (power), 14 NC, 15 NC, 16 VCC (power), 17 NC, 18 NC, 19 VCC (power), 20 NC, 21 NC, 22 VCC (power), 23 NC, 24 NC, 25 GND (power), 26 VCC (power), 27 ~{SYNC} (in), 28 OSCIN (in), 29 ~{OSCIN} (in), 30 VCC (power), 31 VCC (power), 32 CPout (out), 33 VCC (power), 34 FIN (in), 35 ~{FIN} (in), 36 BIAS (in), 37 VCC (power), 38 CLKout0 (out), 39 ~{CLKout0} (out), 40 VCC (power), 41 CLKout1 (out), 42 ~{CLKout1} (out), 43 VCC (power), 44 CLKout2 (out), 45 ~{CLKout2} (out), 46 VCC (power), 47 CLKout3 (out), 48 ~{CLKout3} (out), 49 GNDEP (power)

## LMK03001CISQ
designator U?
Precision Clock Conditioner with Integrated VCO; QFN48; Manufacturer: National Semiconductors; Comment2: 1.52GHz 400fs 3.3V; Sort: 510; Tech: SMDR; Manufacturer No: LMK03001CISQ; Package: QFN48; Price: 0
footprint QFN48-1 (QFN48; 48 Leads; Body Width 7.0 mm; Pitch 0.5 mm)
pins: 1 GND (power), 2 Fout (out), 3 VCC (power), 4 CLKuW (in), 5 DATAuW (in), 6 LEuW (in), 7 NC, 8 VCC (power), 9 LDObyp1, 10 LDObyp2, 11 GOE (in), 12 LD (out), 13 VCC (power), 14 CLKout0 (out), 15 ~{CLKout0} (out), 16 VCC (power), 17 CLKout1 (out), 18 ~{CLKout1} (out), 19 VCC (power), 20 CLKout2 (out), 21 ~{CLKout2} (out), 22 VCC (power), 23 CLKout3 (out), 24 ~{CLKout3} (out), 25 GND (power), 26 VCC (power), 27 ~{SYNC} (in), 28 OSCIN (in), 29 ~{OSCIN} (in), 30 VCC (power), 31 VCC (power), 32 CPout (out), 33 VCC (power), 34 NC, 35 NC, 36 BIAS (in), 37 VCC (power), 38 CLKout4 (out), 39 ~{CLKout4} (out), 40 VCC (power), 41 CLKout5 (out), 42 ~{CLKout5} (out), 43 VCC (power), 44 CLKout6 (out), 45 ~{CLKout6} (out), 46 VCC (power), 47 CLKout7 (out), 48 ~{CLKout7} (out), 49 GNDEP (power)